# Altium footprint library EMDC_Packages.PcbLib: 274 footprints (part 1 of 18)
Each footprint in its own frame and in the unit in brackets; x right, y up, seen from the top. Pads: shape width x height; smd on the part's side, far side on the other; paste and mask are expansions set on the pad; w line width, h text height; cw(c..) or ccw(c..) is an arc to the next point about the centre after c.
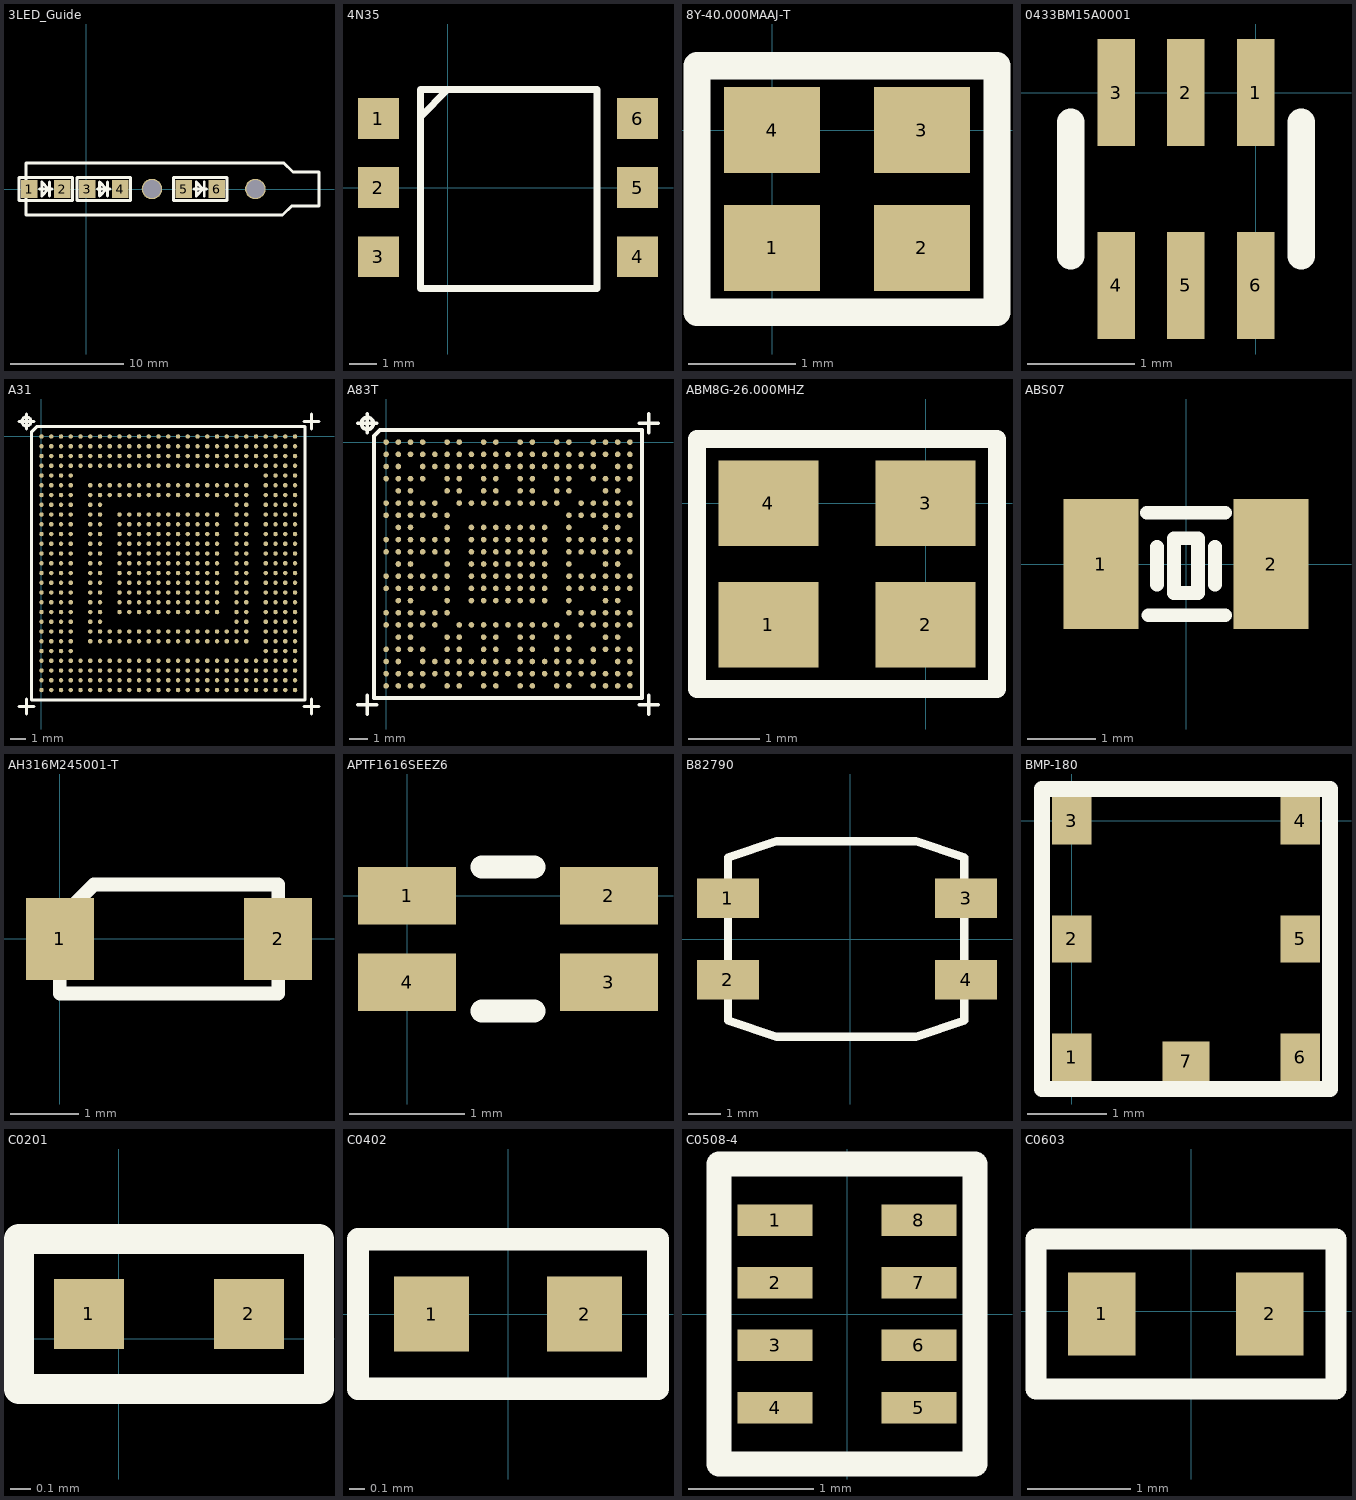
[diagram p0: the footprints below, top view; thin cyan lines are the x and y axes]

## 3LED_Guide [mm] "7511B11"
pads (8):
  rect 1.45x1.6 smd: 1(-5,0) 2(-2.1,0) 3(0.1,0) 4(3,0) 5(8.6,0) 6(11.5,0)
  round 1.8 hole 1.6: ""(5.8,0) ""(14.9,0)
Top Overlay:
  lines w0.254: -4.1,0 -3,0 ; -3.2,-0.6 -3.2,0.6 ; 1,0 2.1,0 ; 1.9,-0.6 1.9,0.6 ; 9.5,0 10.6,0 ; 10.4,-0.6 10.4,0.6 ; 20.4,-1.5 18.1,-1.5 17.3,-2.3 -5.3,-2.3 -5.3,2.3 17.4,2.3 18.2,1.5 20.5,1.5 20.5,-1.5 ; -5.9,-1 -5.9,1 -1.2,1 -1.2,-1 -5.9,-1 ; -3.9,-0.6 -3.3,0 -3.9,0.6 -3.9,-0.6 ; -0.8,-1 3.9,-1 3.9,1 -0.8,1 -0.8,-1 ; 1.2,-0.6 1.2,0.6 1.8,0 1.2,-0.6 ; 7.7,-1 12.4,-1 12.4,1 7.7,1 7.7,-1 ; 9.7,-0.6 9.7,0.6 10.3,0 9.7,-0.6

## 4N35 [mm]
pads (6):
  rect 1.5x1.5 smd: 1(-2.54,2.54) 2(-2.54,0) 3(-2.54,-2.54) 4(6.985,-2.54) 5(6.985,0) 6(6.985,2.54)
Top Overlay:
  lines w0.254: -1,2.5 -1,2.6 0,3.6 ; -1,-3.7 -1,3.6 5.5,3.6 5.5,-3.7 -1,-3.7

## 8Y-40.000MAAJ-T [mm]
pads (4):
  rect 0.9x0.8 smd: 1(0,-1.1) 2(1.4,-1.1) 3(1.4,0) 4(0,0)
Top Overlay:
  lines w0.254: -0.7,-1.7 2.1,-1.7 2.1,0.6 -0.7,0.6 -0.7,-1.7

## 0433BM15A0001 [mm]
pads (6):
  rect 0.35x1 smd: 1(0,0) 2(-0.65,0) 3(-1.3,0) 4(-1.3,-1.8) 5(-0.65,-1.8) 6(0,-1.8)
Top Overlay:
  lines w0.254: -1.725,-1.525 -1.725,-0.275 ; 0.425,-1.525 0.425,-0.275

## A31 [mm]
pads (609):
  round 0.3 smd: A1(0,0) A2(0.65,0) A3(1.3,0) A4(1.95,0) A5(2.6,0) A6(3.25,0) A7(3.9,0) A8(4.55,0) A9(5.2,0) A10(5.85,0) A11(6.5,0) A12(7.15,0) A13(7.8,0) A14(8.45,0) A15(9.1,0) A16(9.75,0) A17(10.4,0) A18(11.05,0) A19(11.7,0) A20(12.35,0) A21(13,0) A22(13.65,0) A23(14.3,0) A24(14.95,0) A25(15.6,0) A26(16.25,0) A27(16.9,0) AA1(0,-13) AA2(0.65,-13) AA3(1.3,-13) AA4(1.95,-13) AA6(3.25,-13) AA7(3.9,-13) AA8(4.55,-13) AA9(5.2,-13) AA10(5.85,-13) AA11(6.5,-13) AA12(7.15,-13) AA13(7.8,-13) AA14(8.45,-13) AA15(9.1,-13) AA16(9.75,-13) AA17(10.4,-13) AA18(11.05,-13) AA19(11.7,-13) AA20(12.35,-13) AA21(13,-13) AA22(13.65,-13) AA24(14.95,-13) AA25(15.6,-13) AA26(16.25,-13) AA27(16.9,-13) AB1(0,-13.65) AB2(0.65,-13.65) AB3(1.3,-13.65) AB4(1.95,-13.65) AB6(3.25,-13.65) AB7(3.9,-13.65) AB8(4.55,-13.65) AB9(5.2,-13.65) AB10(5.85,-13.65) AB11(6.5,-13.65) AB12(7.15,-13.65) AB13(7.8,-13.65) AB14(8.45,-13.65) AB15(9.1,-13.65) AB16(9.75,-13.65) AB17(10.4,-13.65) AB18(11.05,-13.65) AB19(11.7,-13.65) AB20(12.35,-13.65) AB21(13,-13.65) AB22(13.65,-13.65) AB24(14.95,-13.65) AB25(15.6,-13.65) AB26(16.25,-13.65) AB27(16.9,-13.65) AC1(0,-14.3) AC2(0.65,-14.3) AC3(1.3,-14.3) AC4(1.95,-14.3) AC24(14.95,-14.3) AC25(15.6,-14.3) AC26(16.25,-14.3) AC27(16.9,-14.3) AD1(0,-14.95) AD2(0.65,-14.95) AD3(1.3,-14.95) AD4(1.95,-14.95) AD5(2.6,-14.95) AD6(3.25,-14.95) AD7(3.9,-14.95) AD8(4.55,-14.95) AD9(5.2,-14.95) AD10(5.85,-14.95) AD11(6.5,-14.95) AD12(7.15,-14.95) AD13(7.8,-14.95) AD14(8.45,-14.95) AD15(9.1,-14.95) AD16(9.75,-14.95) AD17(10.4,-14.95) AD18(11.05,-14.95) AD19(11.7,-14.95) AD20(12.35,-14.95) AD21(13,-14.95) AD22(13.65,-14.95) AD23(14.3,-14.95) AD24(14.95,-14.95) AD25(15.6,-14.95) AD26(16.25,-14.95) AD27(16.9,-14.95) AE1(0,-15.6) AE2(0.65,-15.6) AE3(1.3,-15.6) AE4(1.95,-15.6) AE5(2.6,-15.6) AE6(3.25,-15.6) AE7(3.9,-15.6) AE8(4.55,-15.6) AE9(5.2,-15.6) AE10(5.85,-15.6) AE11(6.5,-15.6) AE12(7.15,-15.6) AE13(7.8,-15.6) AE14(8.45,-15.6) AE15(9.1,-15.6) AE16(9.75,-15.6) AE17(10.4,-15.6) AE18(11.05,-15.6) AE19(11.7,-15.6) AE20(12.35,-15.6) AE21(13,-15.6) AE22(13.65,-15.6) AE23(14.3,-15.6) AE24(14.95,-15.6) AE25(15.6,-15.6) AE26(16.25,-15.6) AE27(16.9,-15.6) AF1(0,-16.25) AF2(0.65,-16.25) AF3(1.3,-16.25) AF4(1.95,-16.25) AF5(2.6,-16.25) AF6(3.25,-16.25) AF7(3.9,-16.25) AF8(4.55,-16.25) AF9(5.2,-16.25) AF10(5.85,-16.25) AF11(6.5,-16.25) AF12(7.15,-16.25) AF13(7.8,-16.25) AF14(8.45,-16.25) AF15(9.1,-16.25) AF16(9.75,-16.25) AF17(10.4,-16.25) AF18(11.05,-16.25) AF19(11.7,-16.25) AF20(12.35,-16.25) AF21(13,-16.25) AF22(13.65,-16.25) AF23(14.3,-16.25) AF24(14.95,-16.25) AF25(15.6,-16.25) AF26(16.25,-16.25) AF27(16.9,-16.25) AG1(0,-16.9) AG2(0.65,-16.9) AG3(1.3,-16.9) AG4(1.95,-16.9) AG5(2.6,-16.9) AG6(3.25,-16.9) AG7(3.9,-16.9) AG8(4.55,-16.9) AG9(5.2,-16.9) AG10(5.85,-16.9) AG11(6.5,-16.9) AG12(7.15,-16.9) AG13(7.8,-16.9) AG14(8.45,-16.9) AG15(9.1,-16.9) AG16(9.75,-16.9) AG17(10.4,-16.9) AG18(11.05,-16.9) AG19(11.7,-16.9) AG20(12.35,-16.9) AG21(13,-16.9) AG22(13.65,-16.9) AG23(14.3,-16.9) AG24(14.95,-16.9) AG25(15.6,-16.9) AG26(16.25,-16.9) AG27(16.9,-16.9) B1(0,-0.65) B2(0.65,-0.65) B3(1.3,-0.65) B4(1.95,-0.65) B5(2.6,-0.65) B6(3.25,-0.65) B7(3.9,-0.65) B8(4.55,-0.65) B9(5.2,-0.65) B10(5.85,-0.65) B11(6.5,-0.65) B12(7.15,-0.65) B13(7.8,-0.65) B14(8.45,-0.65) B15(9.1,-0.65) B16(9.75,-0.65) B17(10.4,-0.65) B18(11.05,-0.65) B19(11.7,-0.65) B20(12.35,-0.65) B21(13,-0.65) B22(13.65,-0.65) B23(14.3,-0.65) B24(14.95,-0.65) B25(15.6,-0.65) B26(16.25,-0.65) B27(16.9,-0.65) C1(0,-1.3) C2(0.65,-1.3) C3(1.3,-1.3) C4(1.95,-1.3) C5(2.6,-1.3) C6(3.25,-1.3) C7(3.9,-1.3) C8(4.55,-1.3) C9(5.2,-1.3) C10(5.85,-1.3) C11(6.5,-1.3) C12(7.15,-1.3) C13(7.8,-1.3) C14(8.45,-1.3) C15(9.1,-1.3) C16(9.75,-1.3) C17(10.4,-1.3) C18(11.05,-1.3) C19(11.7,-1.3) C20(12.35,-1.3) C21(13,-1.3) C22(13.65,-1.3) C23(14.3,-1.3) C24(14.95,-1.3) C25(15.6,-1.3) C26(16.25,-1.3) C27(16.9,-1.3) D1(0,-1.95) D2(0.65,-1.95) D3(1.3,-1.95) D4(1.95,-1.95) D5(2.6,-1.95) D6(3.25,-1.95) D7(3.9,-1.95) D8(4.55,-1.95) D9(5.2,-1.95) D10(5.85,-1.95) D11(6.5,-1.95) D12(7.15,-1.95) D13(7.8,-1.95) D14(8.45,-1.95) D15(9.1,-1.95) D16(9.75,-1.95) D17(10.4,-1.95) D18(11.05,-1.95) D19(11.7,-1.95) D20(12.35,-1.95) D21(13,-1.95) D22(13.65,-1.95) D23(14.3,-1.95) D24(14.95,-1.95) D25(15.6,-1.95) D26(16.25,-1.95) D27(16.9,-1.95) E1(0,-2.6) E2(0.65,-2.6) E3(1.3,-2.6) E4(1.95,-2.6) E24(14.95,-2.6) E25(15.6,-2.6) E26(16.25,-2.6) E27(16.9,-2.6) F1(0,-3.25) F2(0.65,-3.25) F3(1.3,-3.25) F4(1.95,-3.25) F6(3.25,-3.25) F7(3.9,-3.25) F8(4.55,-3.25) F9(5.2,-3.25) F10(5.85,-3.25) F11(6.5,-3.25) F12(7.15,-3.25) F13(7.8,-3.25) F14(8.45,-3.25) F15(9.1,-3.25) F16(9.75,-3.25) F17(10.4,-3.25) F18(11.05,-3.25) F19(11.7,-3.25) F20(12.35,-3.25) F21(13,-3.25) F22(13.65,-3.25) F24(14.95,-3.25) F25(15.6,-3.25) F26(16.25,-3.25) F27(16.9,-3.25) G1(0,-3.9) G2(0.65,-3.9) G3(1.3,-3.9) G4(1.95,-3.9) G6(3.25,-3.9) G7(3.9,-3.9) G8(4.55,-3.9) G9(5.2,-3.9) G10(5.85,-3.9) G11(6.5,-3.9) G12(7.15,-3.9) G13(7.8,-3.9) G14(8.45,-3.9) G15(9.1,-3.9) G16(9.75,-3.9) G17(10.4,-3.9) G18(11.05,-3.9) G19(11.7,-3.9) G20(12.35,-3.9) G21(13,-3.9) G22(13.65,-3.9) G24(14.95,-3.9) G25(15.6,-3.9) G26(16.25,-3.9) G27(16.9,-3.9) H1(0,-4.55) H2(0.65,-4.55) H3(1.3,-4.55) H4(1.95,-4.55) H6(3.25,-4.55) H7(3.9,-4.55) H21(13,-4.55) H22(13.65,-4.55) H24(14.95,-4.55) H25(15.6,-4.55) H26(16.25,-4.55) H27(16.9,-4.55) J1(0,-5.2) J2(0.65,-5.2) J3(1.3,-5.2) J4(1.95,-5.2) J6(3.25,-5.2) J7(3.9,-5.2) J9(5.2,-5.2) J10(5.85,-5.2) J11(6.5,-5.2) J12(7.15,-5.2) J13(7.8,-5.2) J14(8.45,-5.2) J15(9.1,-5.2) J16(9.75,-5.2) J17(10.4,-5.2) J18(11.05,-5.2) J19(11.7,-5.2) J21(13,-5.2) J22(13.65,-5.2) J24(14.95,-5.2) J25(15.6,-5.2) J26(16.25,-5.2) J27(16.9,-5.2) K1(0,-5.85) K2(0.65,-5.85) K3(1.3,-5.85) K4(1.95,-5.85) K6(3.25,-5.85) K7(3.9,-5.85) K9(5.2,-5.85) K10(5.85,-5.85) K11(6.5,-5.85) K12(7.15,-5.85) K13(7.8,-5.85) K14(8.45,-5.85) K15(9.1,-5.85) K16(9.75,-5.85) K17(10.4,-5.85) K18(11.05,-5.85) K19(11.7,-5.85) K21(13,-5.85) K22(13.65,-5.85) K24(14.95,-5.85) K25(15.6,-5.85) K26(16.25,-5.85) K27(16.9,-5.85) L1(0,-6.5) L2(0.65,-6.5) L3(1.3,-6.5) L4(1.95,-6.5) L6(3.25,-6.5) L7(3.9,-6.5) L9(5.2,-6.5) L10(5.85,-6.5) L11(6.5,-6.5) L12(7.15,-6.5) L13(7.8,-6.5) L14(8.45,-6.5) L15(9.1,-6.5) L16(9.75,-6.5) L17(10.4,-6.5) L18(11.05,-6.5) L19(11.7,-6.5) L21(13,-6.5) L22(13.65,-6.5) L24(14.95,-6.5) L25(15.6,-6.5) L26(16.25,-6.5) L27(16.9,-6.5) M1(0,-7.15) M2(0.65,-7.15) M3(1.3,-7.15) M4(1.95,-7.15) M6(3.25,-7.15) M7(3.9,-7.15) M9(5.2,-7.15) M10(5.85,-7.15) M11(6.5,-7.15) M12(7.15,-7.15) M13(7.8,-7.15) M14(8.45,-7.15) M15(9.1,-7.15) M16(9.75,-7.15) M17(10.4,-7.15) M18(11.05,-7.15) M19(11.7,-7.15) M21(13,-7.15) M22(13.65,-7.15) M24(14.95,-7.15) M25(15.6,-7.15) M26(16.25,-7.15) M27(16.9,-7.15) N1(0,-7.8) N2(0.65,-7.8) N3(1.3,-7.8) N4(1.95,-7.8) N6(3.25,-7.8) N7(3.9,-7.8) N9(5.2,-7.8) N10(5.85,-7.8) N11(6.5,-7.8) N12(7.15,-7.8) N13(7.8,-7.8) N14(8.45,-7.8) N15(9.1,-7.8) N16(9.75,-7.8) N17(10.4,-7.8) N18(11.05,-7.8) N19(11.7,-7.8) N21(13,-7.8) N22(13.65,-7.8) N24(14.95,-7.8) N25(15.6,-7.8) N26(16.25,-7.8) N27(16.9,-7.8) P1(0,-8.45) P2(0.65,-8.45) P3(1.3,-8.45) P4(1.95,-8.45) P6(3.25,-8.45) P7(3.9,-8.45) P9(5.2,-8.45) P10(5.85,-8.45) P11(6.5,-8.45) P12(7.15,-8.45) P13(7.8,-8.45) P14(8.45,-8.45) P15(9.1,-8.45) P16(9.75,-8.45) P17(10.4,-8.45) P18(11.05,-8.45) P19(11.7,-8.45) P21(13,-8.45) P22(13.65,-8.45) P24(14.95,-8.45) P25(15.6,-8.45) P26(16.25,-8.45) P27(16.9,-8.45) R1(0,-9.1) R2(0.65,-9.1) R3(1.3,-9.1) R4(1.95,-9.1) R6(3.25,-9.1) R7(3.9,-9.1) R9(5.2,-9.1) R10(5.85,-9.1) R11(6.5,-9.1) R12(7.15,-9.1) R13(7.8,-9.1) R14(8.45,-9.1) R15(9.1,-9.1) R16(9.75,-9.1) R17(10.4,-9.1) R18(11.05,-9.1) R19(11.7,-9.1) R21(13,-9.1) R22(13.65,-9.1) R24(14.95,-9.1) R25(15.6,-9.1) R26(16.25,-9.1) R27(16.9,-9.1) T1(0,-9.75) T2(0.65,-9.75) T3(1.3,-9.75) T4(1.95,-9.75) T6(3.25,-9.75) T7(3.9,-9.75) T9(5.2,-9.75) T10(5.85,-9.75) T11(6.5,-9.75) T12(7.15,-9.75) T13(7.8,-9.75) T14(8.45,-9.75) T15(9.1,-9.75) T16(9.75,-9.75) T17(10.4,-9.75) T18(11.05,-9.75) T19(11.7,-9.75) T21(13,-9.75) T22(13.65,-9.75) T24(14.95,-9.75) T25(15.6,-9.75) T26(16.25,-9.75) T27(16.9,-9.75) U1(0,-10.4) U2(0.65,-10.4) U3(1.3,-10.4) U4(1.95,-10.4) U6(3.25,-10.4) U7(3.9,-10.4) U9(5.2,-10.4) U10(5.85,-10.4) U11(6.5,-10.4) U12(7.15,-10.4) U13(7.8,-10.4) U14(8.45,-10.4) U15(9.1,-10.4) U16(9.75,-10.4) U17(10.4,-10.4) U18(11.05,-10.4) U19(11.7,-10.4) U21(13,-10.4) U22(13.65,-10.4) U24(14.95,-10.4) U25(15.6,-10.4) U26(16.25,-10.4) U27(16.9,-10.4) V1(0,-11.05) V2(0.65,-11.05) V3(1.3,-11.05) V4(1.95,-11.05) V6(3.25,-11.05) V7(3.9,-11.05) V9(5.2,-11.05) V10(5.85,-11.05) V11(6.5,-11.05) V12(7.15,-11.05) V13(7.8,-11.05) V14(8.45,-11.05) V15(9.1,-11.05) V16(9.75,-11.05) V17(10.4,-11.05) V18(11.05,-11.05) V19(11.7,-11.05) V21(13,-11.05) V22(13.65,-11.05) V24(14.95,-11.05) V25(15.6,-11.05) V26(16.25,-11.05) V27(16.9,-11.05) W1(0,-11.7) W2(0.65,-11.7) W3(1.3,-11.7) W4(1.95,-11.7) W6(3.25,-11.7) W7(3.9,-11.7) W9(5.2,-11.7) W10(5.85,-11.7) W11(6.5,-11.7) W12(7.15,-11.7) W13(7.8,-11.7) W14(8.45,-11.7) W15(9.1,-11.7) W16(9.75,-11.7) W17(10.4,-11.7) W18(11.05,-11.7) W19(11.7,-11.7) W21(13,-11.7) W22(13.65,-11.7) W24(14.95,-11.7) W25(15.6,-11.7) W26(16.25,-11.7) W27(16.9,-11.7) Y1(0,-12.35) Y2(0.65,-12.35) Y3(1.3,-12.35) Y4(1.95,-12.35) Y6(3.25,-12.35) Y7(3.9,-12.35) Y21(13,-12.35) Y22(13.65,-12.35) Y24(14.95,-12.35) Y25(15.6,-12.35) Y26(16.25,-12.35) Y27(16.9,-12.35)
Top Overlay:
  circle w0.2: c-1,1 r0.3
  lines w0.2: -1.5,-18 -0.5,-18 ; -1.5,1 -0.5,1 ; -1,-18.5 -1,-17.5 ; -1,0.5 -1,1.5 ; 17.5,-18 18.5,-18 ; 17.5,1 18.5,1 ; 18,-18.5 18,-17.5 ; 18,0.5 18,1.5 ; -0.65,-17.55 -0.65,0.325 -0.325,0.65 17.55,0.65 17.55,-17.55 -0.65,-17.55

## A83T [mm]
pads (345):
  round 0.3 smd: A1(0,0) A2(0.65,0) A3(1.3,0) A4(1.95,0) A6(3.25,0) A7(3.9,0) A9(5.2,0) A10(5.85,0) A12(7.15,0) A13(7.8,0) A15(9.1,0) A16(9.75,0) A18(11.05,0) A19(11.7,0) A20(12.35,0) A21(13,0) AA1(0,-13) AA2(0.65,-13) AA3(1.3,-13) AA4(1.95,-13) AA6(3.25,-13) AA7(3.9,-13) AA9(5.2,-13) AA10(5.85,-13) AA12(7.15,-13) AA13(7.8,-13) AA15(9.1,-13) AA16(9.75,-13) AA18(11.05,-13) AA19(11.7,-13) AA20(12.35,-13) AA21(13,-13) B1(0,-0.65) B2(0.65,-0.65) B3(1.3,-0.65) B4(1.95,-0.65) B5(2.6,-0.65) B6(3.25,-0.65) B7(3.9,-0.65) B8(4.55,-0.65) B9(5.2,-0.65) B10(5.85,-0.65) B11(6.5,-0.65) B12(7.15,-0.65) B13(7.8,-0.65) B14(8.45,-0.65) B15(9.1,-0.65) B16(9.75,-0.65) B17(10.4,-0.65) B18(11.05,-0.65) B19(11.7,-0.65) B20(12.35,-0.65) B21(13,-0.65) C1(0,-1.3) C2(0.65,-1.3) C4(1.95,-1.3) C5(2.6,-1.3) C6(3.25,-1.3) C7(3.9,-1.3) C8(4.55,-1.3) C9(5.2,-1.3) C10(5.85,-1.3) C11(6.5,-1.3) C12(7.15,-1.3) C13(7.8,-1.3) C14(8.45,-1.3) C15(9.1,-1.3) C16(9.75,-1.3) C17(10.4,-1.3) C18(11.05,-1.3) C20(12.35,-1.3) C21(13,-1.3) D1(0,-1.95) D2(0.65,-1.95) D3(1.3,-1.95) D4(1.95,-1.95) D6(3.25,-1.95) D7(3.9,-1.95) D9(5.2,-1.95) D10(5.85,-1.95) D12(7.15,-1.95) D13(7.8,-1.95) D15(9.1,-1.95) D16(9.75,-1.95) D18(11.05,-1.95) D19(11.7,-1.95) D20(12.35,-1.95) D21(13,-1.95) E2(0.65,-2.6) E3(1.3,-2.6) E6(3.25,-2.6) E7(3.9,-2.6) E9(5.2,-2.6) E10(5.85,-2.6) E12(7.15,-2.6) E13(7.8,-2.6) E15(9.1,-2.6) E16(9.75,-2.6) E19(11.7,-2.6) E20(12.35,-2.6) F1(0,-3.25) F2(0.65,-3.25) F3(1.3,-3.25) F4(1.95,-3.25) F5(2.6,-3.25) F7(3.9,-3.25) F8(4.55,-3.25) F9(5.2,-3.25) F10(5.85,-3.25) F11(6.5,-3.25) F12(7.15,-3.25) F13(7.8,-3.25) F14(8.45,-3.25) F15(9.1,-3.25) F17(10.4,-3.25) F18(11.05,-3.25) F19(11.7,-3.25) F20(12.35,-3.25) F21(13,-3.25) G1(0,-3.9) G2(0.65,-3.9) G3(1.3,-3.9) G4(1.95,-3.9) G5(2.6,-3.9) G6(3.25,-3.9) G16(9.75,-3.9) G17(10.4,-3.9) G18(11.05,-3.9) G19(11.7,-3.9) G20(12.35,-3.9) G21(13,-3.9) H2(0.65,-4.55) H3(1.3,-4.55) H6(3.25,-4.55) H8(4.55,-4.55) H9(5.2,-4.55) H10(5.85,-4.55) H11(6.5,-4.55) H12(7.15,-4.55) H13(7.8,-4.55) H14(8.45,-4.55) H16(9.75,-4.55) H19(11.7,-4.55) H20(12.35,-4.55) J1(0,-5.2) J2(0.65,-5.2) J3(1.3,-5.2) J4(1.95,-5.2) J5(2.6,-5.2) J6(3.25,-5.2) J8(4.55,-5.2) J9(5.2,-5.2) J10(5.85,-5.2) J11(6.5,-5.2) J12(7.15,-5.2) J13(7.8,-5.2) J14(8.45,-5.2) J16(9.75,-5.2) J17(10.4,-5.2) J18(11.05,-5.2) J19(11.7,-5.2) J20(12.35,-5.2) J21(13,-5.2) K1(0,-5.85) K2(0.65,-5.85) K3(1.3,-5.85) K4(1.95,-5.85) K5(2.6,-5.85) K6(3.25,-5.85) K8(4.55,-5.85) K9(5.2,-5.85) K10(5.85,-5.85) K11(6.5,-5.85) K12(7.15,-5.85) K13(7.8,-5.85) K14(8.45,-5.85) K16(9.75,-5.85) K17(10.4,-5.85) K18(11.05,-5.85) K19(11.7,-5.85) K20(12.35,-5.85) K21(13,-5.85) L2(0.65,-6.5) L3(1.3,-6.5) L6(3.25,-6.5) L8(4.55,-6.5) L9(5.2,-6.5) L10(5.85,-6.5) L11(6.5,-6.5) L12(7.15,-6.5) L13(7.8,-6.5) L14(8.45,-6.5) L16(9.75,-6.5) L19(11.7,-6.5) L20(12.35,-6.5) M1(0,-7.15) M2(0.65,-7.15) M3(1.3,-7.15) M4(1.95,-7.15) M5(2.6,-7.15) M6(3.25,-7.15) M8(4.55,-7.15) M9(5.2,-7.15) M10(5.85,-7.15) M11(6.5,-7.15) M12(7.15,-7.15) M13(7.8,-7.15) M14(8.45,-7.15) M16(9.75,-7.15) M17(10.4,-7.15) M18(11.05,-7.15) M19(11.7,-7.15) M20(12.35,-7.15) M21(13,-7.15) N1(0,-7.8) N2(0.65,-7.8) N3(1.3,-7.8) N4(1.95,-7.8) N5(2.6,-7.8) N6(3.25,-7.8) N8(4.55,-7.8) N9(5.2,-7.8) N10(5.85,-7.8) N11(6.5,-7.8) N12(7.15,-7.8) N13(7.8,-7.8) N14(8.45,-7.8) N16(9.75,-7.8) N17(10.4,-7.8) N18(11.05,-7.8) N19(11.7,-7.8) N20(12.35,-7.8) N21(13,-7.8) P2(0.65,-8.45) P3(1.3,-8.45) P6(3.25,-8.45) P8(4.55,-8.45) P9(5.2,-8.45) P10(5.85,-8.45) P11(6.5,-8.45) P12(7.15,-8.45) P13(7.8,-8.45) P14(8.45,-8.45) P16(9.75,-8.45) P19(11.7,-8.45) P20(12.35,-8.45) R1(0,-9.1) R2(0.65,-9.1) R3(1.3,-9.1) R4(1.95,-9.1) R5(2.6,-9.1) R6(3.25,-9.1) R16(9.75,-9.1) R17(10.4,-9.1) R18(11.05,-9.1) R19(11.7,-9.1) R20(12.35,-9.1) R21(13,-9.1) T1(0,-9.75) T2(0.65,-9.75) T3(1.3,-9.75) T4(1.95,-9.75) T5(2.6,-9.75) T7(3.9,-9.75) T8(4.55,-9.75) T9(5.2,-9.75) T10(5.85,-9.75) T11(6.5,-9.75) T12(7.15,-9.75) T13(7.8,-9.75) T14(8.45,-9.75) T15(9.1,-9.75) T17(10.4,-9.75) T18(11.05,-9.75) T19(11.7,-9.75) T20(12.35,-9.75) T21(13,-9.75) U2(0.65,-10.4) U3(1.3,-10.4) U6(3.25,-10.4) U7(3.9,-10.4) U9(5.2,-10.4) U10(5.85,-10.4) U12(7.15,-10.4) U13(7.8,-10.4) U15(9.1,-10.4) U16(9.75,-10.4) U19(11.7,-10.4) U20(12.35,-10.4) V1(0,-11.05) V2(0.65,-11.05) V3(1.3,-11.05) V4(1.95,-11.05) V6(3.25,-11.05) V7(3.9,-11.05) V9(5.2,-11.05) V10(5.85,-11.05) V12(7.15,-11.05) V13(7.8,-11.05) V15(9.1,-11.05) V16(9.75,-11.05) V18(11.05,-11.05) V19(11.7,-11.05) V20(12.35,-11.05) V21(13,-11.05) W1(0,-11.7) W2(0.65,-11.7) W4(1.95,-11.7) W5(2.6,-11.7) W6(3.25,-11.7) W7(3.9,-11.7) W8(4.55,-11.7) W9(5.2,-11.7) W10(5.85,-11.7) W11(6.5,-11.7) W12(7.15,-11.7) W13(7.8,-11.7) W14(8.45,-11.7) W15(9.1,-11.7) W16(9.75,-11.7) W17(10.4,-11.7) W18(11.05,-11.7) W20(12.35,-11.7) W21(13,-11.7) Y1(0,-12.35) Y2(0.65,-12.35) Y3(1.3,-12.35) Y4(1.95,-12.35) Y5(2.6,-12.35) Y6(3.25,-12.35) Y7(3.9,-12.35) Y8(4.55,-12.35) Y9(5.2,-12.35) Y10(5.85,-12.35) Y11(6.5,-12.35) Y12(7.15,-12.35) Y13(7.8,-12.35) Y14(8.45,-12.35) Y15(9.1,-12.35) Y16(9.75,-12.35) Y17(10.4,-12.35) Y18(11.05,-12.35) Y19(11.7,-12.35) Y20(12.35,-12.35) Y21(13,-12.35)
Top Overlay:
  circle w0.2: c-1,1 r0.316
  lines w0.2: -1.5,-14 -0.5,-14 ; -1.5,1 -0.5,1 ; -1,-14.5 -1,-13.5 ; -1,0.5 -1,1.5 ; 13.5,-14 14.5,-14 ; 13.5,1 14.5,1 ; 14,-14.5 14,-13.5 ; 14,0.5 14,1.5 ; -0.65,-13.65 13.65,-13.65 13.65,0.65 -0.325,0.65 -0.65,0.325 -0.65,-13.65

## ABM8G-26.000MHZ [mm]
pads (4):
  rect 1.4x1.2 smd: 1(-2.2,-1.7) 2(0,-1.7) 3(0,0) 4(-2.2,0)
Top Overlay:
  lines w0.254: -3.2,-2.6 -3.2,0.9 1,0.9 1,-2.6 -3.2,-2.6

## ABS07 [mm] "Quartz ABS07 package"
pads (2):
  rect 1.1x1.9 smd: 1(-1.25,0) 2(1.25,0)
Top Overlay:
  lines w0.2: -0.575,0.75 0.575,0.75 ; -0.55,-0.75 0.575,-0.75 ; -0.425,-0.3 -0.425,0.25 ; 0.425,-0.3 0.425,0.25 ; -0.175,-0.425 -0.175,0.375 0.175,0.375 0.175,-0.425 -0.175,-0.425
3D body: height 0.9, standoff 0, extent -1.599,-0.749 1.599,0.749

## AH316M245001-T [mm] "AH316M245001-T 2.4GHz antenna"
pads (2):
  rect 1x1.2 smd: 1(0,0) 2(3.2,0)
Top Overlay:
  lines w0.2: 0,-0.8 0,0.3 0.5,0.8 3.2,0.8 3.2,-0.8 0,-0.8

## APTF1616SEEZ6 [mm] "RGB LED Kingbright APTF1616SEEZ6"
pads (4):
  rect 0.85x0.5 smd: 1(0,0) 2(1.75,0) 3(1.75,-0.75) 4(0,-0.75)
Top Overlay:
  lines w0.2: 0.65,-1 1.1,-1 ; 0.65,0.25 1.1,0.25

## B82790 [mm]
pads (4):
  rect 1.9x1.2 smd: 1(-3.75,1.25) 2(-3.75,-1.25) 3(3.55,1.25) 4(3.55,-1.25)
Top Overlay:
  lines w0.254: -3.75,-2.5 -2.25,-3 2,-3 3.5,-2.5 3.5,2.5 2,3 -2.25,3 -3.75,2.5 -3.75,-2.5
3D body "User Library-B82790.STEP": height 5.21, standoff 0.01, extent -4.582,-3 4.402,3

## BMP-180 [mm]
pads (7):
  rect 0.5x0.6 smd: 1(0,-3) 2(0,-1.5) 3(0,0) 4(2.9,0) 5(2.9,-1.5) 6(2.9,-3)
  rect 0.6x0.5 smd: 7(1.45,-3.05)
Top Overlay:
  lines w0.2: -0.375,-3.4 3.275,-3.4 3.275,0.4 -0.375,0.4 -0.375,-3.4
3D body "User Library-BST-BMP180.STEP": height 0.98, standoff 0, extent -0.35,-3.4 3.25,0.4

## C0201 [mm] "SMD Body 0.6 x 0.3 mm (LxW typ)"
height 0.35
pads (2):
  rect 0.35x0.35 smd: 1(-0.15,0.125) 2(0.65,0.125)
Top Overlay:
  lines w0.15: -0.5,-0.25 1,-0.25 1,0.5 -0.5,0.5 -0.5,-0.25
3D body "User Library-res0201-1.STEP": height 0.23, standoff 0, extent -0.05,-0.025 0.55,0.275

## C0402 [mm]
pads (2):
  rect 0.5x0.5 smd: 1(-0.51,0) 2(0.51,0)
Top Overlay:
  lines w0.15: -1,-0.5 -1,0.5 1,0.5 1,-0.5 -1,-0.5
3D body "User Library-0402C.step": height 0.36, standoff 0, extent -0.5,-0.275 0.5,0.255

## C0508-4 [mm] "Capacitor array (4 caps)"
pads (8):
  rect 0.6x0.25 smd: 1(-0.575,0.75) 2(-0.575,0.25) 3(-0.575,-0.25) 4(-0.575,-0.75) 5(0.575,-0.75) 6(0.575,-0.25) 7(0.575,0.25) 8(0.575,0.75)
Top Overlay:
  lines w0.2: -1.025,-1.2 1.025,-1.2 1.025,1.2 -1.025,1.2 -1.025,-1.2
3D body "User Library-lla215.step": height 0.52, standoff 0, extent -0.64,-1 0.64,1

## C0603 [mm]
pads (2):
  rect 0.65x0.8 smd: 1(-0.865,-0.025) 2(0.76,-0.025)
Top Overlay:
  lines w0.2: -1.5,-0.75 1.4,-0.75 1.4,0.7 -1.5,0.7 -1.5,-0.75
3D body "User Library-Chip Resistor_0603 (1608).STEP": height 0.47, standoff 0, extent -0.825,-0.425 0.775,0.377